# Altium footprint library THD_TO.PCBLIB: 47 footprints (part 3 of 3)
Each footprint in its own frame and in the unit in brackets; x right, y up, seen from the top. Pads: shape width x height; smd on the part's side, far side on the other; paste and mask are expansions set on the pad; w line width, h text height; cw(c..) or ccw(c..) is an arc to the next point about the centre after c.
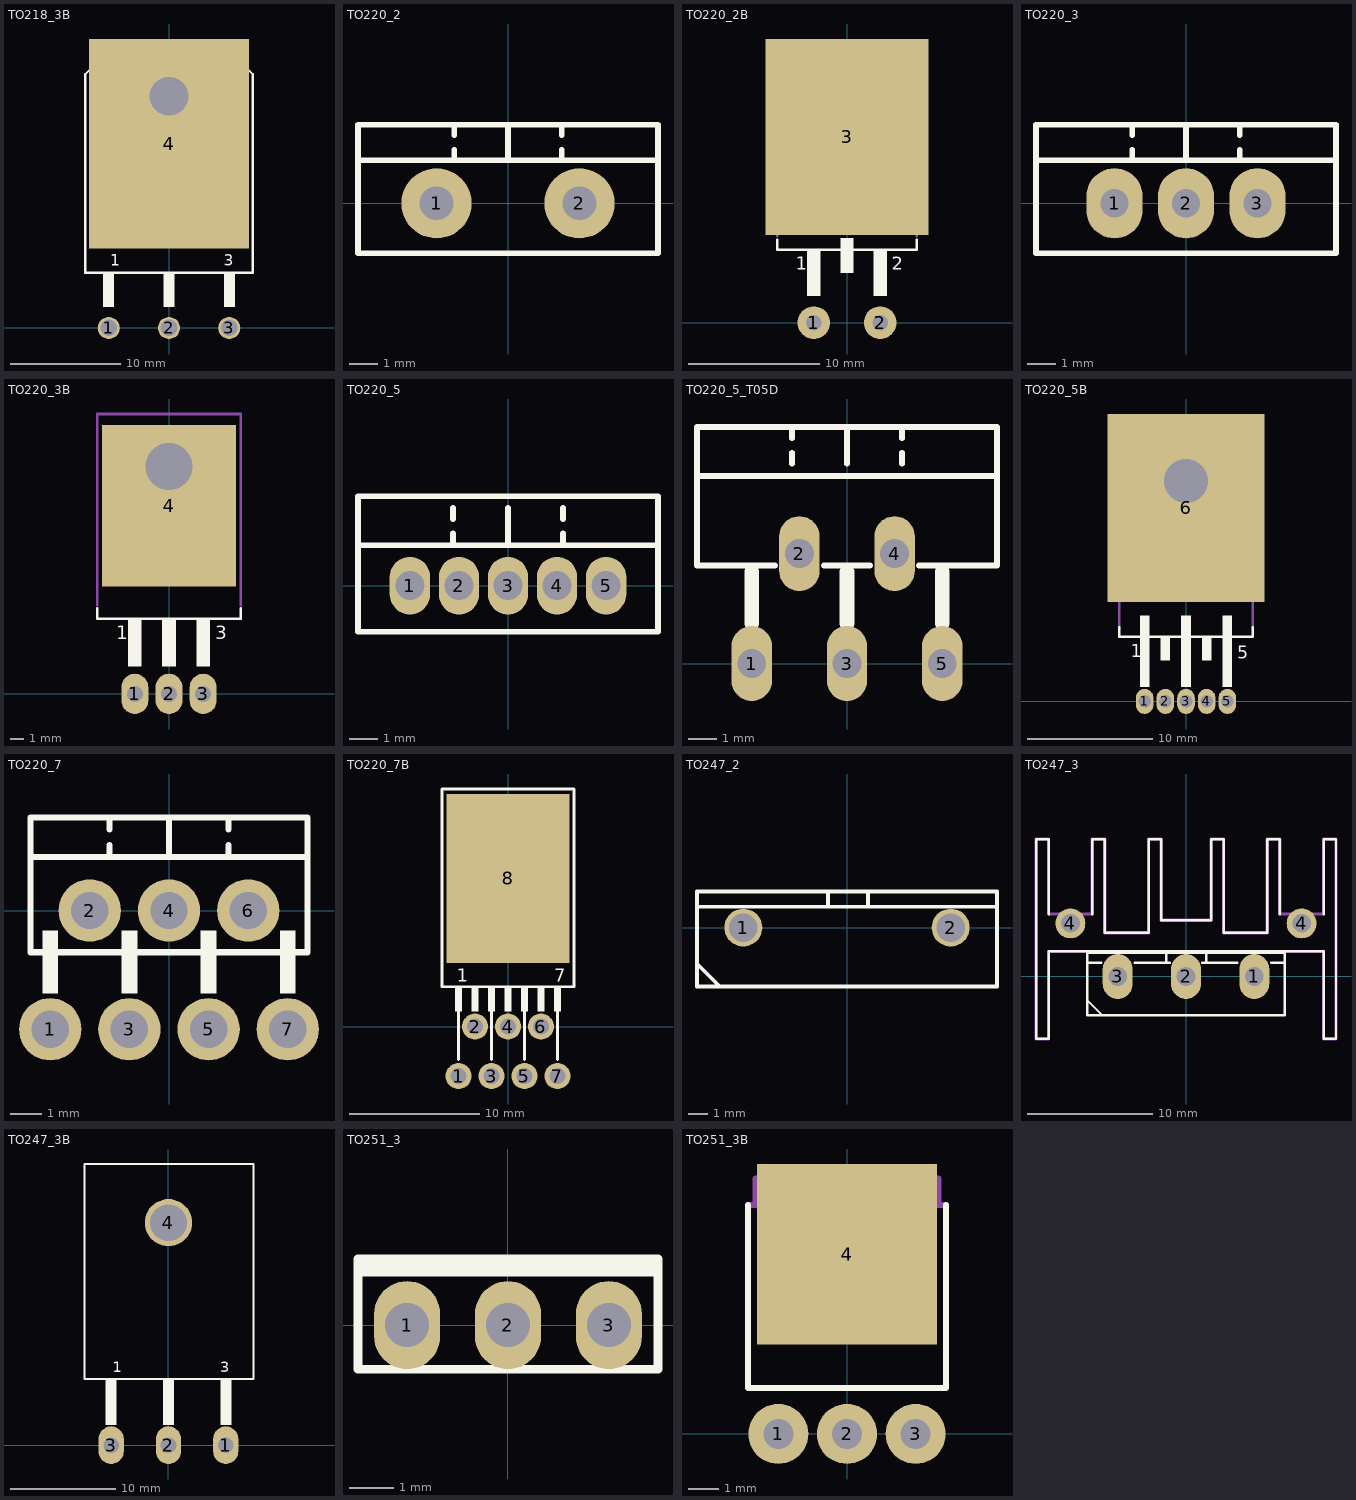
[diagram p2: the footprints below, top view; thin cyan lines are the x and y axes]

## TO218_3B [mm] "O218, TO-218, SOT-93, pitch: 5.5mm BENDED"
pads (4):
  round 2 / inner round 2 / far side oval 2.4x3.6 hole 1.5: 1(-5.461,0) 2(0,0) 3(5.461,0)
  rect 14.5x19 smd: 4(0,16.701)
via 0,21.012 diameter 3.5 hole 3.5
TopOverlay:
  rectangle: -0.508,1.9 0.508,5
  rectangle: -5.988,1.9 -4.972,5
  region: 5.988,5 4.972,5 4.972,1.9 5.988,1.9
  lines w0.2: -7.6,5 -7.6,23 -5.6,25 5.6,25 7.6,23 7.6,5 -7.6,5
  text "1" at -5.334,5.653 h1.02
  text "3" at 4.953,5.653 h1.02
Mechanical1:
  circle w0.2: c0,21 r2
3D body "User Library-TO218-O.STEP": height 4.82, standoff -3, extent -7.499,-0.319 7.501,24.909

## TO220_2 [mm]
pads (2):
  round 2.5 hole 1.2: 1(-2.54,0) 2(2.54,0)
TopOverlay:
  lines w0.2: -5.334,1.524 5.334,1.524 ; -1.905,1.524 -1.905,1.905 ; -1.905,2.413 -1.905,2.794 ; 0,1.524 0,2.794 ; 1.905,1.524 1.905,1.905 ; 1.905,2.413 1.905,2.794 ; -5.334,-1.778 -5.334,2.794 5.334,2.794 5.334,-1.778 -5.334,-1.778
3D body "User Library-TO220-2_V-S.STEP": height 19.3, standoff -2.9, extent -5,-1.7 5,2.8

## TO220_2B [mm]
pads (3):
  round 2.5 hole 1.2: 1(-2.54,-0.012) 2(2.54,-0.012)
  rect 12.5x15 smd: 3(0,14.2)
TopOverlay:
  rectangle: 2.032,2.02 3.048,5.576
  rectangle: -3.048,2.02 -2.032,5.576
  rectangle: -0.508,3.798 0.508,6.465
  lines w0.2: -5.334,6.338 -5.334,5.576 5.334,5.576 5.334,6.338
  text "2" at 3.429,4.052 h1.02
  text "1" at -3.937,4.052 h1.02
Mechanical1:
  circle w0.2: c0,17.768 r2.032
  lines w0.2: -5.334,6.592 -5.334,20.816 5.334,20.816 5.334,6.592
3D body "User Library-TO220-2_V-S.STEP": height 4.52, standoff 0.02, extent -5,-1 5,21.2

## TO220_3 [mm] "TO-220 3 LEAD, TO-262, pitch: 2.54mm  10x4.5mm"
pads (3):
  oval 2x2.5 hole 1: 1(-2.54,0) 2(0,0) 3(2.54,0)
TopOverlay:
  lines w0.2: -5.334,1.524 5.334,1.524 ; -1.905,1.524 -1.905,1.905 ; -1.905,2.413 -1.905,2.794 ; 0,1.524 0,2.794 ; 1.905,1.524 1.905,1.905 ; 1.905,2.413 1.905,2.794 ; -5.334,-1.778 -5.334,2.794 5.334,2.794 5.334,-1.778 -5.334,-1.778
3D body "User Library-TO3B_(TO220)_1.step": height 19, standoff -9.4, extent -5.2,-1.85 5.2,2.65

## TO220_3B [mm] "TO-220 3LEAD, pitch: 2.54mm  10x15mm"
pads (4):
  oval 2x3 hole 1.2: 1(-2.54,0) 2(0,0) 3(2.54,0)
  rect 10x12 smd: 4(0,14)
via 0,16.912 diameter 3.5 hole 3.5
TopOverlay:
  rectangle: -0.508,2.032 0.508,5.588
  rectangle: 2.032,2.032 3.048,5.588
  rectangle: -3.048,2.032 -2.032,5.588
  lines w0.2: -5.334,6.35 -5.334,5.588 5.334,5.588 5.334,6.35
  text "3" at 3.429,4.064 h1.02
  text "1" at -3.937,4.064 h1.02
Mechanical1:
  circle w0.2: c0,16.9 r2
  lines w0.2: -5.334,6.604 -5.334,20.828 5.334,20.828 5.334,6.604
3D body "User Library-TO220 L.step": height 4.5, standoff -3, extent -5,0 5,19.704

## TO220_5 [mm] "TO-220 STRAIGHT, T05A pitch: 1.7mm"
pads (5):
  oval 1.4x2 hole 1: 1(-3.4,0) 2(-1.7,0) 3(0,0) 4(1.7,0) 5(3.4,0)
TopOverlay:
  lines w0.2: -5.2,1.4 5.2,1.4 ; -1.905,1.424 -1.905,1.805 ; -1.905,2.313 -1.905,2.694 ; 0,1.424 0,2.694 ; 1.905,1.424 1.905,1.805 ; 1.905,2.313 1.905,2.694 ; -5.2,-1.6 5.2,-1.6 5.2,3.1 -5.2,3.1 -5.2,-1.6
3D body "User Library-TO220-5T PCB.step": height 17.05, standoff -6.52, extent -5.06,-1.55 5.06,2.907

## TO220_5_T05D [mm] "TO-220 BEND, T05D, PENTAWATT"
pads (5):
  oval 1.4x2.6 hole 1: 1(-3.302,0) 2(-1.651,3.81) 3(0,0) 4(1.651,3.81) 5(3.302,0)
TopOverlay:
  lines w0.2: -5.2,6.5 5.1,6.5 ; -2.5,3.4 -5.2,3.4 -5.2,8.2 5.2,8.2 5.2,3.4 2.5,3.4 ; -1.905,6.923 -1.905,7.304 ; -1.905,7.812 -1.905,8.193 ; -0.8,3.4 0.8,3.4 ; 0,6.923 0,8.193 ; 1.905,6.923 1.905,7.304 ; 1.905,7.812 1.905,8.193
  lines w0.508: -3.302,1.397 -3.302,3.175 ; 0,1.397 0,3.175 ; 3.302,1.397 3.302,3.175
3D body "SW3dPS-TO220-5 BEND-LEAD.STEP": height 22.35, standoff -1.64, extent -5.08,-0.183 5.08,8.057

## TO220_5B [mm]
pads (6):
  oval 1.4x2 hole 1: 1(-3.302,0) 2(-1.651,0) 3(0,0) 4(1.651,0) 5(3.302,0)
  rect 12.5x15 smd: 6(0,15.447)
via 0,17.612 diameter 3.5 hole 3.5
TopOverlay:
  rectangle: 1.27,3.253 2.032,5.158
  rectangle: -2.032,3.253 -1.27,5.158
  rectangle: 2.921,1.143 3.683,6.858
  rectangle: -0.381,1.143 0.381,6.858
  rectangle: -3.683,1.143 -2.921,6.858
  lines w0.2: -5.334,5.92 -5.334,5.158 5.334,5.158 5.334,5.92
  text "5" at 4.1,3.42 h1.02
  text "1" at -4.4,3.52 h1.02
Mechanical1:
  circle w0.2: c0,17.6 r2
  lines w0.2: -5.334,5.874 -5.334,20.098 5.334,20.098 5.334,5.874
3D body "User Library-TO-220-5 BEND.STEP": height 4.56, standoff -5.94, extent -5.081,0 5.081,20.168

## TO220_7 [mm]
pads (7):
  round 2 hole 1.2: 1(-3.81,-3.81) 2(-2.54,0) 3(-1.27,-3.81) 4(0,0) 5(1.27,-3.81) 6(2.54,0) 7(3.81,-3.81)
TopOverlay:
  rectangle: -4.064,-2.667 -3.556,-0.635
  rectangle: -1.524,-2.667 -1.016,-0.635
  rectangle: 1.016,-2.667 1.524,-0.635
  rectangle: 3.556,-2.667 4.064,-0.635
  lines w0.2: -4.445,1.713 4.445,1.713 ; -1.905,1.713 -1.905,2.094 ; -1.905,2.602 -1.905,2.983 ; 0,1.713 0,2.983 ; 1.905,1.713 1.905,2.094 ; 1.905,2.602 1.905,2.983 ; -4.445,-1.335 4.445,-1.335 4.445,2.983 -4.445,2.983 -4.445,-1.335
3D body "User Library-TO-220-7.step": height 20.3, standoff -3.22, extent -5.08,-3.9 5.08,2.838

## TO220_7B [mm]
pads (8):
  round 2 hole 1.2: 1(-3.81,-3.81) 2(-2.54,0) 3(-1.27,-3.81) 4(0,0) 5(1.27,-3.81) 6(2.54,0) 7(3.81,-3.81)
  rect 9.5x13 smd: 8(0,11.41)
TopOverlay:
  circle w0.2: c0,15.24 r2.032
  rectangle: 3.556,1.143 4.064,3.048
  rectangle: 2.286,1.143 2.794,3.048
  rectangle: 1.016,1.143 1.524,3.048
  rectangle: -0.254,1.143 0.254,3.048
  rectangle: -1.524,1.143 -1.016,3.048
  rectangle: -2.794,1.143 -2.286,3.048
  rectangle: -4.064,1.143 -3.556,3.048
  lines w0.2: -3.81,-2.54 -3.81,3.048 ; -1.27,-2.54 -1.27,3.048 ; 1.27,-2.54 1.27,3.048 ; 3.81,-2.54 3.81,3.048 ; -5.08,3.048 -5.08,18.288 5.08,18.288 5.08,3.048 -5.08,3.048
  text "7" at 3.556,3.429 h1.02
  text "1" at -3.937,3.429 h1.02

## TO247_2 [mm]
height 2
pads (2):
  round 2 / inner round 2 / far side oval 2.4x3.6 hole 1.5: 1(-5.461,0) 2(5.461,0)
TopOverlay:
  lines w0.2: -7.9,-1.9 -6.7,-3.1 ; -7.9,1.1 7.9,1.1 ; -1,1.1 -1,1.9 ; 1.1,1.1 1.1,1.9 ; -7.9,-3.1 -7.9,1.9 7.9,1.9 7.9,-3.1 -7.9,-3.1
3D body "User Library-TO-3P-3LD.step": height 23.9, standoff -16, extent -7.8,-3 7.8,1.8

## TO247_3 [mm] "TO247, TO-247, TO-3P pitch: 5.5mm 16x5mm, TO-218"
pads (5):
  oval 2.4x3.6 hole 1.5: 1(5.461,0) 2(0,0) 3(-5.461,0)
  round 2.4 hole 1.5: 4(-9.25,4.25) 4(9.25,4.25)
TopOverlay:
  lines w0.2: -11,5 -11,11 -12,11 -12,-5 -11,-5 -11,2 11,2 11,-5 12,-5 12,11 11,11 11,5 ; -7.9,-1.9 -6.7,-3.1 ; -7.9,1.1 -6.8,1.1 ; -7.5,5 -7.5,11 -6.5,11 -6.5,3.5 -3,3.5 -3,11 -2,11 -2,4.5 2,4.5 2,11 3,11 3,3.5 6.5,3.5 6.5,11 7.5,11 7.5,5 ; -4.1,1.1 -1.3,1.1 ; -1.6,1.1 -1.6,1.9 ; 1.3,1.1 4.1,1.1 ; 1.6,1.1 1.6,1.9 ; 6.8,1.1 7.9,1.1 ; -7.9,-3.1 7.9,-3.1 7.9,1.9 -7.9,1.9 -7.9,-3.1
Mechanical13:
  lines w0.254: -12,-5 -12,11 ; -12,-5 -12,-5 ; -12,-5 -11,-5 ; -12,11 -11,11 -11,5 -7.5,5 -7.5,11 -6.5,11 -6.5,3.5 -3,3.5 -3,11 -2,11 -2,4.5 2,4.5 2,11 3,11 3,3.5 6.5,3.5 6.5,11 7.5,11 7.5,5 11,5 11,11 12,11 ; -12,11 -12,11 ; -11,-5 -11,-5 ; -11,-5 -11,2 11,2 11,-5 ; 11,-5 11,-5 ; 11,-5 12,-5 12,11 ; 12,11 12,11
3D body "User Library-TO-3P-3LD.step": height 24.5, standoff -15.4, extent -7.8,-3 7.8,1.8
3D body "TO-220-15 (Multiwatt 15) solid.sldprt": height 25, standoff -4, extent -12,-5 12,11

## TO247_3B [mm] "TO247, TO-247, TO-3P BENDED, pitch: 5.5mm  TO-218"
pads (4):
  oval 2.4x3.6 hole 1.5: 1(5.461,0) 2(0,0) 3(-5.461,0)
  round 4.5 hole 3.5: 4(0,21.212)
TopOverlay:
  rectangle: -0.508,1.9 0.508,6.3
  rectangle: -5.988,1.9 -4.972,6.3
  region: 5.988,6.3 4.972,6.3 4.972,1.9 5.988,1.9
  lines w0.2: -8,6.318 8.1,6.318 8.1,26.8 -8,26.8 -8,6.318
  text "1" at -5.334,6.953 h1.02
  text "3" at 4.953,6.953 h1.02
Mechanical1:
  circle w0.2: c0,21.2 r2
3D body "User Library-TO-247_bent_leads.step": height 5.4, standoff -6.6, extent -7.95,-0.3 7.95,26.682

## TO251_3 [mm] "TO-251 IPAK pitch: 2.3mm 6.5x6.5mm"
pads (3):
  oval 1.5x2 hole 1: 1(-2.286,0) 2(0,0) 3(2.286,0)
TopOverlay:
  rectangle: -3.3,1.1 3.3,1.505
  lines w0.2: -3.4,-1 -3.4,1.5 3.4,1.5 3.4,-1 -3.4,-1
3D body "User Library-TO-251AA(IPak).step": height 9.46, standoff -3.92, extent -3.3,-0.9 3.3,1.4

## TO251_3B [mm] "TO251, TO-251, IPAK BEND pitch: 2.3mm 6.5x6.5mm"
pads (4):
  round 2 hole 1: 1(-2.286,0) 2(0,0) 3(2.286,0)
  rect 6x6 smd: 4(0,5.984)
TopOverlay:
  lines w0.2: -3.302,7.62 -3.302,1.524 3.302,1.524 3.302,7.62
Mechanical1:
  lines w0.2: -3.302,7.62 3.302,7.62 ; -3.048,7.62 -3.048,8.509 3.048,8.509 3.048,7.62
3D body "User Library-TO-251AA(IPak).step": height 2.4, standoff 0.1, extent -3.3,-4.92 3.3,8.46